# Altium footprint library PCB_CONNECTORS.PcbLib: 676 footprints (part 25 of 43) (continued)
## PHOENIX_1757284 [mm] "PHOENIX MSTBA Serie, Pitch 5.08mm, 12A, 250V, 6 Positions Header"
height 8.6
pads (6):
  round 2.1 hole 1.4: 1(-12.7,0) 2(-7.62,0) 3(-2.54,0) 4(2.54,0) 5(7.62,0) 6(12.7,0)
Top Overlay:
  lines w0.2: -16.24,-8.626 16.24,-8.626 ; -16.24,-7 16.24,-7 ; -13.675,-10 -13.305,-8.7 -12.095,-8.7 -11.725,-10 ; -13.356,-8.88 -12.044,-8.88 ; -12.945,-8.7 -12.932,-8.75 -12.468,-8.75 -12.455,-8.7 ; -8.595,-10 -8.225,-8.7 -7.015,-8.7 -6.645,-10 ; -8.276,-8.88 -6.964,-8.88 ; -7.865,-8.7 -7.852,-8.75 -7.388,-8.75 -7.375,-8.7 ; -3.515,-10 -3.145,-8.7 -1.935,-8.7 -1.565,-10 ; -3.196,-8.88 -1.884,-8.88 ; -2.785,-8.7 -2.772,-8.75 -2.308,-8.75 -2.295,-8.7 ; 1.565,-10 1.935,-8.7 3.145,-8.7 3.515,-10 ; 1.884,-8.88 3.196,-8.88 ; 2.295,-8.7 2.308,-8.75 2.772,-8.75 2.785,-8.7 ; 6.645,-10 7.015,-8.7 8.225,-8.7 8.595,-10 ; 6.964,-8.88 8.276,-8.88 ; 7.375,-8.7 7.388,-8.75 7.852,-8.75 7.865,-8.7 ; 11.725,-10 12.095,-8.7 13.305,-8.7 13.675,-10 ; 12.044,-8.88 13.356,-8.88 ; 12.455,-8.7 12.468,-8.75 12.932,-8.75 12.945,-8.7 ; -16.24,-10 -16.24,2 16.24,2 16.24,-10 -16.24,-10 ; -10.361,-1.05 -10.16,-1.8 -9.959,-1.05 -10.361,-1.05 ; -5.281,-1.05 -5.08,-1.8 -4.879,-1.05 -5.281,-1.05 ; -0.201,-1.05 0,-1.8 0.201,-1.05 -0.201,-1.05 ; 4.879,-1.05 5.08,-1.8 5.281,-1.05 4.879,-1.05 ; 9.959,-1.05 10.16,-1.8 10.361,-1.05 9.959,-1.05
  text "4" at 2.22,-2.4 h1
  text "1" at -12.98,-2.4 h1
  text "2" at -7.98,-2.4 h1
  text "3" at -2.98,-2.4 h1
  text "5" at 7.3,-2.4 h1
  text "6" at 12.38,-2.4 h1
Mechanical 8:
  lines w0.1: -0.5,0 0,0 ; 0,-0.5 0,0 ; 0,0.5 0,0 ; 0.5,0 0,0 ; -12.7,0 -13.2,0 -12.7,0 ; -12.7,0 -12.7,-0.5 -12.7,0 ; -12.7,0 -12.2,0 -12.7,0 ; -12.7,0 -12.7,0.5 -12.7,0 ; -7.62,0 -8.12,0 -7.62,0 ; -7.62,0 -7.62,-0.5 -7.62,0 ; -7.62,0 -7.12,0 -7.62,0 ; -7.62,0 -7.62,0.5 -7.62,0 ; -2.54,0 -3.04,0 -2.54,0 ; -2.54,0 -2.54,-0.5 -2.54,0 ; -2.54,0 -2.04,0 -2.54,0 ; -2.54,0 -2.54,0.5 -2.54,0 ; 2.54,0 2.04,0 2.54,0 ; 2.54,0 2.54,-0.5 2.54,0 ; 2.54,0 3.04,0 2.54,0 ; 2.54,0 2.54,0.5 2.54,0 ; 7.62,0 7.12,0 7.62,0 ; 7.62,0 7.62,-0.5 7.62,0 ; 7.62,0 8.12,0 7.62,0 ; 7.62,0 7.62,0.5 7.62,0 ; 12.7,0 12.2,0 12.7,0 ; 12.7,0 12.7,-0.5 12.7,0 ; 12.7,0 13.2,0 12.7,0 ; 12.7,0 12.7,0.5 12.7,0
Mechanical 14:
  lines w0.1: -16.24,-8.626 16.24,-8.626 ; -16.24,-7 16.24,-7 ; -13.675,-10 -13.305,-8.7 -12.095,-8.7 -11.725,-10 ; -13.356,-8.88 -12.044,-8.88 ; -12.945,-8.7 -12.932,-8.75 -12.468,-8.75 -12.455,-8.7 ; -8.595,-10 -8.225,-8.7 -7.015,-8.7 -6.645,-10 ; -8.276,-8.88 -6.964,-8.88 ; -7.865,-8.7 -7.852,-8.75 -7.388,-8.75 -7.375,-8.7 ; -3.515,-10 -3.145,-8.7 -1.935,-8.7 -1.565,-10 ; -3.196,-8.88 -1.884,-8.88 ; -2.785,-8.7 -2.772,-8.75 -2.308,-8.75 -2.295,-8.7 ; 1.565,-10 1.935,-8.7 3.145,-8.7 3.515,-10 ; 1.884,-8.88 3.196,-8.88 ; 2.295,-8.7 2.308,-8.75 2.772,-8.75 2.785,-8.7 ; 6.645,-10 7.015,-8.7 8.225,-8.7 8.595,-10 ; 6.964,-8.88 8.276,-8.88 ; 7.375,-8.7 7.388,-8.75 7.852,-8.75 7.865,-8.7 ; 11.725,-10 12.095,-8.7 13.305,-8.7 13.675,-10 ; 12.044,-8.88 13.356,-8.88 ; 12.455,-8.7 12.468,-8.75 12.932,-8.75 12.945,-8.7 ; -16.24,-10 -16.24,2 16.24,2 16.24,-10 -16.24,-10 ; -10.361,-1.05 -10.16,-1.8 -9.959,-1.05 -10.361,-1.05 ; -5.281,-1.05 -5.08,-1.8 -4.879,-1.05 -5.281,-1.05 ; -0.201,-1.05 0,-1.8 0.201,-1.05 -0.201,-1.05 ; 4.879,-1.05 5.08,-1.8 5.281,-1.05 4.879,-1.05 ; 9.959,-1.05 10.16,-1.8 10.361,-1.05 9.959,-1.05
3D body "PHOENIX_1757284.stp": height 8.6, standoff -3.5, extent -16.24,-10 16.24,2.002

## PHOENIX_1757307 [mm] "PHOENIX MSTBA Serie, Pitch 5.08mm, 12A, 250V, 8 Positions Header"
height 8.6
pads (8):
  round 2.1 hole 1.4: 1(-17.78,0) 2(-12.7,0) 3(-7.62,0) 4(-2.54,0) 5(2.54,0) 6(7.62,0) 7(12.7,0) 8(17.78,0)
Top Overlay:
  lines w0.2: -21.32,-8.626 21.32,-8.626 ; -21.32,-7 21.32,-7 ; -18.755,-10 -18.385,-8.7 -17.175,-8.7 -16.805,-10 ; -18.436,-8.88 -17.124,-8.88 ; -13.675,-10 -13.305,-8.7 -12.095,-8.7 -11.725,-10 ; -13.356,-8.88 -12.044,-8.88 ; -8.595,-10 -8.225,-8.7 -7.015,-8.7 -6.645,-10 ; -8.276,-8.88 -6.964,-8.88 ; -3.515,-10 -3.145,-8.7 -1.935,-8.7 -1.565,-10 ; -3.196,-8.88 -1.884,-8.88 ; 1.565,-10 1.935,-8.7 3.145,-8.7 3.515,-10 ; 1.884,-8.88 3.196,-8.88 ; 6.645,-10 7.015,-8.7 8.225,-8.7 8.595,-10 ; 6.964,-8.88 8.276,-8.88 ; 11.725,-10 12.095,-8.7 13.305,-8.7 13.675,-10 ; 12.044,-8.88 13.356,-8.88 ; 16.805,-10 17.175,-8.7 18.385,-8.7 18.755,-10 ; 17.124,-8.88 18.436,-8.88 ; -21.32,-10 -21.32,2 21.32,2 21.32,-10 -21.32,-10 ; -15.441,-1.05 -15.039,-1.05 -15.24,-1.8 -15.441,-1.05 ; -10.361,-1.05 -10.16,-1.8 -9.959,-1.05 -10.361,-1.05 ; -5.281,-1.05 -5.08,-1.8 -4.879,-1.05 -5.281,-1.05 ; -0.201,-1.05 0,-1.8 0.201,-1.05 -0.201,-1.05 ; 4.879,-1.05 5.08,-1.8 5.281,-1.05 4.879,-1.05 ; 9.959,-1.05 10.16,-1.8 10.361,-1.05 9.959,-1.05 ; 15.039,-1.05 15.441,-1.05 15.24,-1.8 15.039,-1.05
  text "8" at 17.46,-2.4 h1
  text "5" at 2.26,-2.4 h1
  text "6" at 7.26,-2.4 h1
  text "7" at 12.26,-2.4 h1
  text "4" at -2.86,-2.4 h1
  text "1" at -18.06,-2.4 h1
  text "2" at -13.06,-2.4 h1
  text "3" at -8.06,-2.4 h1
Mechanical 8:
  lines w0.1: -0.5,0 0,0 ; 0,-0.5 0,0 ; 0,0.5 0,0 ; 0.5,0 0,0 ; -17.78,0 -18.28,0 -17.78,0 ; -17.78,0 -17.78,-0.5 -17.78,0 ; -17.78,0 -17.28,0 -17.78,0 ; -17.78,0 -17.78,0.5 -17.78,0 ; -12.7,0 -13.2,0 -12.7,0 ; -12.7,0 -12.7,-0.5 -12.7,0 ; -12.7,0 -12.2,0 -12.7,0 ; -12.7,0 -12.7,0.5 -12.7,0 ; -7.62,0 -8.12,0 -7.62,0 ; -7.62,0 -7.62,-0.5 -7.62,0 ; -7.62,0 -7.12,0 -7.62,0 ; -7.62,0 -7.62,0.5 -7.62,0 ; -2.54,0 -3.04,0 -2.54,0 ; -2.54,0 -2.54,-0.5 -2.54,0 ; -2.54,0 -2.04,0 -2.54,0 ; -2.54,0 -2.54,0.5 -2.54,0 ; 2.54,0 2.04,0 2.54,0 ; 2.54,0 2.54,-0.5 2.54,0 ; 2.54,0 3.04,0 2.54,0 ; 2.54,0 2.54,0.5 2.54,0 ; 7.62,0 7.12,0 7.62,0 ; 7.62,0 7.62,-0.5 7.62,0 ; 7.62,0 8.12,0 7.62,0 ; 7.62,0 7.62,0.5 7.62,0 ; 12.7,0 12.2,0 12.7,0 ; 12.7,0 12.7,-0.5 12.7,0 ; 12.7,0 13.2,0 12.7,0 ; 12.7,0 12.7,0.5 12.7,0 ; 17.78,0 17.28,0 17.78,0 ; 17.78,0 17.78,-0.5 17.78,0 ; 17.78,0 18.28,0 17.78,0 ; 17.78,0 17.78,0.5 17.78,0
Mechanical 14:
  lines w0.1: -21.32,-8.626 21.32,-8.626 ; -21.32,-7 21.32,-7 ; -18.755,-10 -18.385,-8.7 -17.175,-8.7 -16.805,-10 ; -18.436,-8.88 -17.124,-8.88 ; -18.025,-8.7 -18.012,-8.75 -17.548,-8.75 -17.535,-8.7 ; -13.675,-10 -13.305,-8.7 -12.095,-8.7 -11.725,-10 ; -13.356,-8.88 -12.044,-8.88 ; -12.945,-8.7 -12.932,-8.75 -12.468,-8.75 -12.455,-8.7 ; -8.595,-10 -8.225,-8.7 -7.015,-8.7 -6.645,-10 ; -8.276,-8.88 -6.964,-8.88 ; -7.865,-8.7 -7.852,-8.75 -7.388,-8.75 -7.375,-8.7 ; -3.515,-10 -3.145,-8.7 -1.935,-8.7 -1.565,-10 ; -3.196,-8.88 -1.884,-8.88 ; -2.785,-8.7 -2.772,-8.75 -2.308,-8.75 -2.295,-8.7 ; 1.565,-10 1.935,-8.7 3.145,-8.7 3.515,-10 ; 1.884,-8.88 3.196,-8.88 ; 2.295,-8.7 2.308,-8.75 2.772,-8.75 2.785,-8.7 ; 6.645,-10 7.015,-8.7 8.225,-8.7 8.595,-10 ; 6.964,-8.88 8.276,-8.88 ; 7.375,-8.7 7.388,-8.75 7.852,-8.75 7.865,-8.7 ; 11.725,-10 12.095,-8.7 13.305,-8.7 13.675,-10 ; 12.044,-8.88 13.356,-8.88 ; 12.455,-8.7 12.468,-8.75 12.932,-8.75 12.945,-8.7 ; 16.805,-10 17.175,-8.7 18.385,-8.7 18.755,-10 ; 17.124,-8.88 18.436,-8.88 ; 17.535,-8.7 17.548,-8.75 18.012,-8.75 18.025,-8.7 ; -21.32,-10 -21.32,2 21.32,2 21.32,-10 -21.32,-10 ; -15.441,-1.05 -15.039,-1.05 -15.24,-1.8 -15.441,-1.05 ; -10.361,-1.05 -10.16,-1.8 -9.959,-1.05 -10.361,-1.05 ; -5.281,-1.05 -5.08,-1.8 -4.879,-1.05 -5.281,-1.05 ; -0.201,-1.05 0,-1.8 0.201,-1.05 -0.201,-1.05 ; 4.879,-1.05 5.08,-1.8 5.281,-1.05 4.879,-1.05 ; 9.959,-1.05 10.16,-1.8 10.361,-1.05 9.959,-1.05 ; 15.039,-1.05 15.441,-1.05 15.24,-1.8 15.039,-1.05
3D body "PHOENIX_1757307.stp": height 8.6, standoff -3.5, extent -21.32,-10 21.32,2.002

## PHOENIX_1757310 [mm] "PHOENIX MSTBA Serie, Pitch 5.08mm, 12A, 250V, 9 Positions Header"
height 8.6
pads (9):
  round 2.1 hole 1.4: 1(-20.32,0) 2(-15.24,0) 3(-10.16,0) 4(-5.08,0) 5(0,0) 6(5.08,0) 7(10.16,0) 8(15.24,0) 9(20.32,0)
Top Overlay:
  lines w0.2: -23.86,-8.626 23.86,-8.626 ; -23.86,-7 23.86,-7 ; -21.295,-10 -20.925,-8.7 -19.715,-8.7 -19.345,-10 ; -20.976,-8.88 -19.664,-8.88 ; -20.565,-8.7 -20.552,-8.75 -20.088,-8.75 -20.075,-8.7 ; -16.215,-10 -15.845,-8.7 -14.635,-8.7 -14.265,-10 ; -15.896,-8.88 -14.584,-8.88 ; -15.485,-8.7 -15.472,-8.75 -15.008,-8.75 -14.995,-8.7 ; -11.135,-10 -10.765,-8.7 -9.555,-8.7 -9.185,-10 ; -10.816,-8.88 -9.504,-8.88 ; -10.405,-8.7 -10.392,-8.75 -9.928,-8.75 -9.915,-8.7 ; -6.055,-10 -5.685,-8.7 -4.475,-8.7 -4.105,-10 ; -5.736,-8.88 -4.424,-8.88 ; -5.325,-8.7 -5.312,-8.75 -4.848,-8.75 -4.835,-8.7 ; -0.975,-10 -0.605,-8.7 0.605,-8.7 0.975,-10 ; -0.656,-8.88 0.656,-8.88 ; -0.245,-8.7 -0.232,-8.75 0.232,-8.75 0.245,-8.7 ; 4.105,-10 4.475,-8.7 5.685,-8.7 6.055,-10 ; 4.424,-8.88 5.736,-8.88 ; 4.835,-8.7 4.848,-8.75 5.312,-8.75 5.325,-8.7 ; 9.185,-10 9.555,-8.7 10.765,-8.7 11.135,-10 ; 9.504,-8.88 10.816,-8.88 ; 9.915,-8.7 9.928,-8.75 10.392,-8.75 10.405,-8.7 ; 14.265,-10 14.635,-8.7 15.845,-8.7 16.215,-10 ; 14.584,-8.88 15.896,-8.88 ; 14.995,-8.7 15.008,-8.75 15.472,-8.75 15.485,-8.7 ; 19.345,-10 19.715,-8.7 20.925,-8.7 21.295,-10 ; 19.664,-8.88 20.976,-8.88 ; 20.075,-8.7 20.088,-8.75 20.552,-8.75 20.565,-8.7 ; -23.86,-10 23.86,-10 23.86,2 -23.86,2 -23.86,-10 ; -17.981,-1.05 -17.579,-1.05 -17.78,-1.8 -17.981,-1.05 ; -12.901,-1.05 -12.499,-1.05 -12.7,-1.8 -12.901,-1.05 ; -7.821,-1.05 -7.419,-1.05 -7.62,-1.8 -7.821,-1.05 ; -2.741,-1.05 -2.339,-1.05 -2.54,-1.8 -2.741,-1.05 ; 2.339,-1.05 2.741,-1.05 2.54,-1.8 2.339,-1.05 ; 7.419,-1.05 7.821,-1.05 7.62,-1.8 7.419,-1.05 ; 12.499,-1.05 12.901,-1.05 12.7,-1.8 12.499,-1.05 ; 17.579,-1.05 17.981,-1.05 17.78,-1.8 17.579,-1.05
  text "3" at -10.6,-2.4 h1
  text "2" at -15.6,-2.4 h1
  text "1" at -20.6,-2.4 h1
  text "4" at -5.4,-2.4 h1
  text "7" at 9.72,-2.4 h1
  text "6" at 4.72,-2.4 h1
  text "5" at -0.28,-2.4 h1
  text "8" at 14.92,-2.4 h1
  text "9" at 20,-2.4 h1
Mechanical 8:
  lines w0.1: -0.5,0 0,0 ; 0,-0.5 0,0 ; 0,0.5 0,0 ; 0.5,0 0,0 ; -20.32,0 -20.32,0.5 -20.32,0 ; -20.32,0 -19.82,0 -20.32,0 ; -20.32,0 -20.32,-0.5 -20.32,0 ; -20.32,0 -20.82,0 -20.32,0 ; -15.24,0 -15.24,0.5 -15.24,0 ; -15.24,0 -14.74,0 -15.24,0 ; -15.24,0 -15.24,-0.5 -15.24,0 ; -15.24,0 -15.74,0 -15.24,0 ; -10.16,0 -10.16,0.5 -10.16,0 ; -10.16,0 -9.66,0 -10.16,0 ; -10.16,0 -10.16,-0.5 -10.16,0 ; -10.16,0 -10.66,0 -10.16,0 ; -5.08,0 -5.08,0.5 -5.08,0 ; -5.08,0 -4.58,0 -5.08,0 ; -5.08,0 -5.08,-0.5 -5.08,0 ; -5.08,0 -5.58,0 -5.08,0 ; 5.08,0 5.08,0.5 5.08,0 ; 5.08,0 5.58,0 5.08,0 ; 5.08,0 5.08,-0.5 5.08,0 ; 5.08,0 4.58,0 5.08,0 ; 10.16,0 10.16,0.5 10.16,0 ; 10.16,0 10.66,0 10.16,0 ; 10.16,0 10.16,-0.5 10.16,0 ; 10.16,0 9.66,0 10.16,0 ; 15.24,0 15.24,0.5 15.24,0 ; 15.24,0 15.74,0 15.24,0 ; 15.24,0 15.24,-0.5 15.24,0 ; 15.24,0 14.74,0 15.24,0 ; 20.32,0 20.32,0.5 20.32,0 ; 20.32,0 20.82,0 20.32,0 ; 20.32,0 20.32,-0.5 20.32,0 ; 20.32,0 19.82,0 20.32,0
Mechanical 14:
  lines w0.1: -23.86,-8.626 23.86,-8.626 ; -23.86,-7 23.86,-7 ; -21.295,-10 -20.925,-8.7 -19.715,-8.7 -19.345,-10 ; -20.976,-8.88 -19.664,-8.88 ; -20.565,-8.7 -20.552,-8.75 -20.088,-8.75 -20.075,-8.7 ; -16.215,-10 -15.845,-8.7 -14.635,-8.7 -14.265,-10 ; -15.896,-8.88 -14.584,-8.88 ; -15.485,-8.7 -15.472,-8.75 -15.008,-8.75 -14.995,-8.7 ; -11.135,-10 -10.765,-8.7 -9.555,-8.7 -9.185,-10 ; -10.816,-8.88 -9.504,-8.88 ; -10.405,-8.7 -10.392,-8.75 -9.928,-8.75 -9.915,-8.7 ; -6.055,-10 -5.685,-8.7 -4.475,-8.7 -4.105,-10 ; -5.736,-8.88 -4.424,-8.88 ; -5.325,-8.7 -5.312,-8.75 -4.848,-8.75 -4.835,-8.7 ; -0.975,-10 -0.605,-8.7 0.605,-8.7 0.975,-10 ; -0.656,-8.88 0.656,-8.88 ; -0.245,-8.7 -0.232,-8.75 0.232,-8.75 0.245,-8.7 ; 4.105,-10 4.475,-8.7 5.685,-8.7 6.055,-10 ; 4.424,-8.88 5.736,-8.88 ; 4.835,-8.7 4.848,-8.75 5.312,-8.75 5.325,-8.7 ; 9.185,-10 9.555,-8.7 10.765,-8.7 11.135,-10 ; 9.504,-8.88 10.816,-8.88 ; 9.915,-8.7 9.928,-8.75 10.392,-8.75 10.405,-8.7 ; 14.265,-10 14.635,-8.7 15.845,-8.7 16.215,-10 ; 14.584,-8.88 15.896,-8.88 ; 14.995,-8.7 15.008,-8.75 15.472,-8.75 15.485,-8.7 ; 19.345,-10 19.715,-8.7 20.925,-8.7 21.295,-10 ; 19.664,-8.88 20.976,-8.88 ; 20.075,-8.7 20.088,-8.75 20.552,-8.75 20.565,-8.7 ; -23.86,-10 23.86,-10 23.86,2 -23.86,2 -23.86,-10 ; -17.981,-1.05 -17.579,-1.05 -17.78,-1.8 -17.981,-1.05 ; -12.901,-1.05 -12.499,-1.05 -12.7,-1.8 -12.901,-1.05 ; -7.821,-1.05 -7.419,-1.05 -7.62,-1.8 -7.821,-1.05 ; -2.741,-1.05 -2.339,-1.05 -2.54,-1.8 -2.741,-1.05 ; 2.339,-1.05 2.741,-1.05 2.54,-1.8 2.339,-1.05 ; 7.419,-1.05 7.821,-1.05 7.62,-1.8 7.419,-1.05 ; 12.499,-1.05 12.901,-1.05 12.7,-1.8 12.499,-1.05 ; 17.579,-1.05 17.981,-1.05 17.78,-1.8 17.579,-1.05
3D body "PHOENIX_1757310.stp": height 8.6, standoff -3.5, extent -23.86,-10 23.86,2.002

## PHOENIX_1757323 [mm] "PHOENIX MSTBA Serie, Pitch 5.08mm, 12A, 250V, 10 Positions Header"
height 8.6
pads (10):
  round 2.1 hole 1.4: 1(-22.86,0) 2(-17.78,0) 3(-12.7,0) 4(-7.62,0) 5(-2.54,0) 6(2.54,0) 7(7.62,0) 8(12.7,0) 9(17.78,0) 10(22.86,0)
Top Overlay:
  lines w0.2: -26.4,-8.626 26.4,-8.626 ; -26.4,-7 26.4,-7 ; -23.835,-10 -23.465,-8.7 -22.255,-8.7 -21.885,-10 ; -23.516,-8.88 -22.204,-8.88 ; -23.105,-8.7 -23.092,-8.75 -22.628,-8.75 -22.615,-8.7 ; -18.755,-10 -18.385,-8.7 -17.175,-8.7 -16.805,-10 ; -18.436,-8.88 -17.124,-8.88 ; -18.025,-8.7 -18.012,-8.75 -17.548,-8.75 -17.535,-8.7 ; -13.675,-10 -13.305,-8.7 -12.095,-8.7 -11.725,-10 ; -13.356,-8.88 -12.044,-8.88 ; -12.945,-8.7 -12.932,-8.75 -12.468,-8.75 -12.455,-8.7 ; -8.595,-10 -8.225,-8.7 -7.015,-8.7 -6.645,-10 ; -8.276,-8.88 -6.964,-8.88 ; -7.865,-8.7 -7.852,-8.75 -7.388,-8.75 -7.375,-8.7 ; -3.515,-10 -3.145,-8.7 -1.935,-8.7 -1.565,-10 ; -3.196,-8.88 -1.884,-8.88 ; -2.785,-8.7 -2.772,-8.75 -2.308,-8.75 -2.295,-8.7 ; 1.565,-10 1.935,-8.7 3.145,-8.7 3.515,-10 ; 1.884,-8.88 3.196,-8.88 ; 2.295,-8.7 2.308,-8.75 2.772,-8.75 2.785,-8.7 ; 6.645,-10 7.015,-8.7 8.225,-8.7 8.595,-10 ; 6.964,-8.88 8.276,-8.88 ; 7.375,-8.7 7.388,-8.75 7.852,-8.75 7.865,-8.7 ; 11.725,-10 12.095,-8.7 13.305,-8.7 13.675,-10 ; 12.044,-8.88 13.356,-8.88 ; 12.455,-8.7 12.468,-8.75 12.932,-8.75 12.945,-8.7 ; 16.805,-10 17.175,-8.7 18.385,-8.7 18.755,-10 ; 17.124,-8.88 18.436,-8.88 ; 17.535,-8.7 17.548,-8.75 18.012,-8.75 18.025,-8.7 ; 21.885,-10 22.255,-8.7 23.465,-8.7 23.835,-10 ; 22.204,-8.88 23.516,-8.88 ; 22.615,-8.7 22.628,-8.75 23.092,-8.75 23.105,-8.7 ; -26.4,-10 -26.4,2 26.4,2 26.4,-10 -26.4,-10 ; -20.521,-1.05 -20.32,-1.8 -20.119,-1.05 -20.521,-1.05 ; -15.441,-1.05 -15.24,-1.8 -15.039,-1.05 -15.441,-1.05 ; -10.361,-1.05 -10.16,-1.8 -9.959,-1.05 -10.361,-1.05 ; -5.281,-1.05 -5.08,-1.8 -4.879,-1.05 -5.281,-1.05 ; -0.201,-1.05 0,-1.8 0.201,-1.05 -0.201,-1.05 ; 4.879,-1.05 5.08,-1.8 5.281,-1.05 4.879,-1.05 ; 9.959,-1.05 10.16,-1.8 10.361,-1.05 9.959,-1.05 ; 15.039,-1.05 15.24,-1.8 15.441,-1.05 15.039,-1.05 ; 20.119,-1.05 20.32,-1.8 20.521,-1.05 20.119,-1.05
  text "10" at 22.2,-2.4 h1
  text "9" at 17.46,-2.4 h1
  text "8" at 12.38,-2.4 h1
  text "5" at -2.82,-2.4 h1
  text "6" at 2.18,-2.4 h1
  text "7" at 7.18,-2.4 h1
  text "4" at -7.94,-2.4 h1
  text "1" at -23.14,-2.4 h1
  text "2" at -18.14,-2.4 h1
  text "3" at -13.14,-2.4 h1
Mechanical 8:
  lines w0.1: -3.04,0 -2.54,0 ; -2.54,-0.5 -2.54,0 ; -2.54,0.5 -2.54,0 ; -2.04,0 -2.54,0 ; -0.5,0 0,0 ; 0,-0.5 0,0 ; 0,0.5 0,0 ; 0.5,0 0,0 ; -22.86,0 -23.36,0 -22.86,0 ; -22.86,0 -22.86,-0.5 -22.86,0 ; -22.86,0 -22.36,0 -22.86,0 ; -22.86,0 -22.86,0.5 -22.86,0 ; -17.78,0 -18.28,0 -17.78,0 ; -17.78,0 -17.78,-0.5 -17.78,0 ; -17.78,0 -17.28,0 -17.78,0 ; -17.78,0 -17.78,0.5 -17.78,0 ; -12.7,0 -13.2,0 -12.7,0 ; -12.7,0 -12.7,-0.5 -12.7,0 ; -12.7,0 -12.2,0 -12.7,0 ; -12.7,0 -12.7,0.5 -12.7,0 ; 2.54,0 2.04,0 2.54,0 ; 2.54,0 2.54,-0.5 2.54,0 ; 2.54,0 3.04,0 2.54,0 ; 2.54,0 2.54,0.5 2.54,0 ; 7.62,0 7.12,0 7.62,0 ; 7.62,0 7.62,-0.5 7.62,0 ; 7.62,0 8.12,0 7.62,0 ; 7.62,0 7.62,0.5 7.62,0 ; 12.7,0 12.2,0 12.7,0 ; 12.7,0 12.7,-0.5 12.7,0 ; 12.7,0 13.2,0 12.7,0 ; 12.7,0 12.7,0.5 12.7,0 ; 17.78,0 17.28,0 17.78,0 ; 17.78,0 17.78,-0.5 17.78,0 ; 17.78,0 18.28,0 17.78,0 ; 17.78,0 17.78,0.5 17.78,0 ; 22.86,0 22.36,0 22.86,0 ; 22.86,0 22.86,-0.5 22.86,0 ; 22.86,0 23.36,0 22.86,0 ; 22.86,0 22.86,0.5 22.86,0
Mechanical 14:
  lines w0.1: -26.4,-8.626 26.4,-8.626 ; -26.4,-7 26.4,-7 ; -23.835,-10 -23.465,-8.7 -22.255,-8.7 -21.885,-10 ; -23.516,-8.88 -22.204,-8.88 ; -23.105,-8.7 -23.092,-8.75 -22.628,-8.75 -22.615,-8.7 ; -18.755,-10 -18.385,-8.7 -17.175,-8.7 -16.805,-10 ; -18.436,-8.88 -17.124,-8.88 ; -18.025,-8.7 -18.012,-8.75 -17.548,-8.75 -17.535,-8.7 ; -13.675,-10 -13.305,-8.7 -12.095,-8.7 -11.725,-10 ; -13.356,-8.88 -12.044,-8.88 ; -12.945,-8.7 -12.932,-8.75 -12.468,-8.75 -12.455,-8.7 ; -8.595,-10 -8.225,-8.7 -7.015,-8.7 -6.645,-10 ; -8.276,-8.88 -6.964,-8.88 ; -7.865,-8.7 -7.852,-8.75 -7.388,-8.75 -7.375,-8.7 ; -3.515,-10 -3.145,-8.7 -1.935,-8.7 -1.565,-10 ; -3.196,-8.88 -1.884,-8.88 ; -2.785,-8.7 -2.772,-8.75 -2.308,-8.75 -2.295,-8.7 ; 1.565,-10 1.935,-8.7 3.145,-8.7 3.515,-10 ; 1.884,-8.88 3.196,-8.88 ; 2.295,-8.7 2.308,-8.75 2.772,-8.75 2.785,-8.7 ; 6.645,-10 7.015,-8.7 8.225,-8.7 8.595,-10 ; 6.964,-8.88 8.276,-8.88 ; 7.375,-8.7 7.388,-8.75 7.852,-8.75 7.865,-8.7 ; 11.725,-10 12.095,-8.7 13.305,-8.7 13.675,-10 ; 12.044,-8.88 13.356,-8.88 ; 12.455,-8.7 12.468,-8.75 12.932,-8.75 12.945,-8.7 ; 16.805,-10 17.175,-8.7 18.385,-8.7 18.755,-10 ; 17.124,-8.88 18.436,-8.88 ; 17.535,-8.7 17.548,-8.75 18.012,-8.75 18.025,-8.7 ; 21.885,-10 22.255,-8.7 23.465,-8.7 23.835,-10 ; 22.204,-8.88 23.516,-8.88 ; 22.615,-8.7 22.628,-8.75 23.092,-8.75 23.105,-8.7 ; -26.4,-10 -26.4,2 26.4,2 26.4,-10 -26.4,-10 ; -20.521,-1.05 -20.32,-1.8 -20.119,-1.05 -20.521,-1.05 ; -15.441,-1.05 -15.24,-1.8 -15.039,-1.05 -15.441,-1.05 ; -10.361,-1.05 -10.16,-1.8 -9.959,-1.05 -10.361,-1.05 ; -5.281,-1.05 -5.08,-1.8 -4.879,-1.05 -5.281,-1.05 ; -0.201,-1.05 0,-1.8 0.201,-1.05 -0.201,-1.05 ; 4.879,-1.05 5.08,-1.8 5.281,-1.05 4.879,-1.05 ; 9.959,-1.05 10.16,-1.8 10.361,-1.05 9.959,-1.05 ; 15.039,-1.05 15.24,-1.8 15.441,-1.05 15.039,-1.05 ; 20.119,-1.05 20.32,-1.8 20.521,-1.05 20.119,-1.05
3D body "PHOENIX_1757323.stp": height 8.6, standoff -3.5, extent -26.4,-10 26.4,2.002

## PHOENIX_1757349 [mm] "PHOENIX MSTBA Serie, Pitch 5.08mm, 12A, 250V, 12 Positions Header"
height 8.6
pads (12):
  round 2.1 hole 1.4: 1(-27.94,0) 2(-22.86,0) 3(-17.78,0) 4(-12.7,0) 5(-7.62,0) 6(-2.54,0) 7(2.54,0) 8(7.62,0) 9(12.7,0) 10(17.78,0) 11(22.86,0) 12(27.94,0)
Top Overlay:
  lines w0.2: -31.48,-8.626 31.48,-8.626 ; -31.48,-7 31.48,-7 ; -28.915,-10 -28.545,-8.7 -27.335,-8.7 -26.965,-10 ; -28.596,-8.88 -27.284,-8.88 ; -28.185,-8.7 -28.172,-8.75 -27.708,-8.75 -27.695,-8.7 ; -23.835,-10 -23.465,-8.7 -22.255,-8.7 -21.885,-10 ; -23.516,-8.88 -22.204,-8.88 ; -23.105,-8.7 -23.092,-8.75 -22.628,-8.75 -22.615,-8.7 ; -18.755,-10 -18.385,-8.7 -17.175,-8.7 -16.805,-10 ; -18.436,-8.88 -17.124,-8.88 ; -18.025,-8.7 -18.012,-8.75 -17.548,-8.75 -17.535,-8.7 ; -13.675,-10 -13.305,-8.7 -12.095,-8.7 -11.725,-10 ; -13.356,-8.88 -12.044,-8.88 ; -12.945,-8.7 -12.932,-8.75 -12.468,-8.75 -12.455,-8.7 ; -8.595,-10 -8.225,-8.7 -7.015,-8.7 -6.645,-10 ; -8.276,-8.88 -6.964,-8.88 ; -7.865,-8.7 -7.852,-8.75 -7.388,-8.75 -7.375,-8.7 ; -3.515,-10 -3.145,-8.7 -1.935,-8.7 -1.565,-10 ; -3.196,-8.88 -1.884,-8.88 ; -2.785,-8.7 -2.772,-8.75 -2.308,-8.75 -2.295,-8.7 ; 1.565,-10 1.935,-8.7 3.145,-8.7 3.515,-10 ; 1.884,-8.88 3.196,-8.88 ; 2.295,-8.7 2.308,-8.75 2.772,-8.75 2.785,-8.7 ; 6.645,-10 7.015,-8.7 8.225,-8.7 8.595,-10 ; 6.964,-8.88 8.276,-8.88 ; 7.375,-8.7 7.388,-8.75 7.852,-8.75 7.865,-8.7 ; 11.725,-10 12.095,-8.7 13.305,-8.7 13.675,-10 ; 12.044,-8.88 13.356,-8.88 ; 12.455,-8.7 12.468,-8.75 12.932,-8.75 12.945,-8.7 ; 16.805,-10 17.175,-8.7 18.385,-8.7 18.755,-10 ; 17.124,-8.88 18.436,-8.88 ; 17.535,-8.7 17.548,-8.75 18.012,-8.75 18.025,-8.7 ; 21.885,-10 22.255,-8.7 23.465,-8.7 23.835,-10 ; 22.204,-8.88 23.516,-8.88 ; 22.615,-8.7 22.628,-8.75 23.092,-8.75 23.105,-8.7 ; 26.965,-10 27.335,-8.7 28.545,-8.7 28.915,-10 ; 27.284,-8.88 28.596,-8.88 ; 27.695,-8.7 27.708,-8.75 28.172,-8.75 28.185,-8.7 ; -31.48,-10 -31.48,2 31.48,2 31.48,-10 -31.48,-10 ; -25.601,-1.05 -25.4,-1.8 -25.199,-1.05 -25.601,-1.05 ; -20.521,-1.05 -20.32,-1.8 -20.119,-1.05 -20.521,-1.05 ; -15.441,-1.05 -15.24,-1.8 -15.039,-1.05 -15.441,-1.05 ; -10.361,-1.05 -10.16,-1.8 -9.959,-1.05 -10.361,-1.05 ; -5.281,-1.05 -5.08,-1.8 -4.879,-1.05 -5.281,-1.05 ; -0.201,-1.05 0,-1.8 0.201,-1.05 -0.201,-1.05 ; 4.879,-1.05 5.08,-1.8 5.281,-1.05 4.879,-1.05 ; 9.959,-1.05 10.16,-1.8 10.361,-1.05 9.959,-1.05 ; 15.039,-1.05 15.24,-1.8 15.441,-1.05 15.039,-1.05 ; 20.119,-1.05 20.32,-1.8 20.521,-1.05 20.119,-1.05 ; 25.199,-1.05 25.4,-1.8 25.601,-1.05 25.199,-1.05
  text "10" at 17.12,-2.4 h1
  text "9" at 12.38,-2.4 h1
  text "8" at 7.3,-2.4 h1
  text "5" at -7.9,-2.4 h1
  text "6" at -2.9,-2.4 h1
  text "7" at 2.1,-2.4 h1
  text "4" at -13.02,-2.4 h1
  text "1" at -28.22,-2.4 h1
  text "2" at -23.22,-2.4 h1
  text "3" at -18.22,-2.4 h1
  text "11" at 22.2,-2.4 h1
  text "12" at 27.28,-2.4 h1
Mechanical 8:
  lines w0.1: -3.04,0 -2.54,0 ; -2.54,-0.5 -2.54,0 ; -2.54,0.5 -2.54,0 ; -2.04,0 -2.54,0 ; -0.5,0 0,0 ; 0,-0.5 0,0 ; 0,0.5 0,0 ; 0.5,0 0,0 ; -27.94,0 -28.44,0 -27.94,0 ; -27.94,0 -27.94,-0.5 -27.94,0 ; -27.94,0 -27.44,0 -27.94,0 ; -27.94,0 -27.94,0.5 -27.94,0 ; -22.86,0 -23.36,0 -22.86,0 ; -22.86,0 -22.86,-0.5 -22.86,0 ; -22.86,0 -22.36,0 -22.86,0 ; -22.86,0 -22.86,0.5 -22.86,0 ; -17.78,0 -18.28,0 -17.78,0 ; -17.78,0 -17.78,-0.5 -17.78,0 ; -17.78,0 -17.28,0 -17.78,0 ; -17.78,0 -17.78,0.5 -17.78,0 ; -12.7,0 -13.2,0 -12.7,0 ; -12.7,0 -12.7,-0.5 -12.7,0 ; -12.7,0 -12.2,0 -12.7,0 ; -12.7,0 -12.7,0.5 -12.7,0 ; 2.54,0 2.04,0 2.54,0 ; 2.54,0 2.54,-0.5 2.54,0 ; 2.54,0 3.04,0 2.54,0 ; 2.54,0 2.54,0.5 2.54,0 ; 7.62,0 7.12,0 7.62,0 ; 7.62,0 7.62,-0.5 7.62,0 ; 7.62,0 8.12,0 7.62,0 ; 7.62,0 7.62,0.5 7.62,0 ; 12.7,0 12.2,0 12.7,0 ; 12.7,0 12.7,-0.5 12.7,0 ; 12.7,0 13.2,0 12.7,0 ; 12.7,0 12.7,0.5 12.7,0 ; 17.78,0 17.28,0 17.78,0 ; 17.78,0 17.78,-0.5 17.78,0 ; 17.78,0 18.28,0 17.78,0 ; 17.78,0 17.78,0.5 17.78,0 ; 22.86,0 22.36,0 22.86,0 ; 22.86,0 22.86,-0.5 22.86,0 ; 22.86,0 23.36,0 22.86,0 ; 22.86,0 22.86,0.5 22.86,0 ; 27.94,0 27.44,0 27.94,0 ; 27.94,0 27.94,-0.5 27.94,0 ; 27.94,0 28.44,0 27.94,0 ; 27.94,0 27.94,0.5 27.94,0
Mechanical 14:
  lines w0.1: -31.48,-8.626 31.48,-8.626 ; -31.48,-7 31.48,-7 ; -28.915,-10 -28.545,-8.7 -27.335,-8.7 -26.965,-10 ; -28.596,-8.88 -27.284,-8.88 ; -28.185,-8.7 -28.172,-8.75 -27.708,-8.75 -27.695,-8.7 ; -23.835,-10 -23.465,-8.7 -22.255,-8.7 -21.885,-10 ; -23.516,-8.88 -22.204,-8.88 ; -23.105,-8.7 -23.092,-8.75 -22.628,-8.75 -22.615,-8.7 ; -18.755,-10 -18.385,-8.7 -17.175,-8.7 -16.805,-10 ; -18.436,-8.88 -17.124,-8.88 ; -18.025,-8.7 -18.012,-8.75 -17.548,-8.75 -17.535,-8.7 ; -13.675,-10 -13.305,-8.7 -12.095,-8.7 -11.725,-10 ; -13.356,-8.88 -12.044,-8.88 ; -12.945,-8.7 -12.932,-8.75 -12.468,-8.75 -12.455,-8.7 ; -8.595,-10 -8.225,-8.7 -7.015,-8.7 -6.645,-10 ; -8.276,-8.88 -6.964,-8.88 ; -7.865,-8.7 -7.852,-8.75 -7.388,-8.75 -7.375,-8.7 ; -3.515,-10 -3.145,-8.7 -1.935,-8.7 -1.565,-10 ; -3.196,-8.88 -1.884,-8.88 ; -2.785,-8.7 -2.772,-8.75 -2.308,-8.75 -2.295,-8.7 ; 1.565,-10 1.935,-8.7 3.145,-8.7 3.515,-10 ; 1.884,-8.88 3.196,-8.88 ; 2.295,-8.7 2.308,-8.75 2.772,-8.75 2.785,-8.7 ; 6.645,-10 7.015,-8.7 8.225,-8.7 8.595,-10 ; 6.964,-8.88 8.276,-8.88 ; 7.375,-8.7 7.388,-8.75 7.852,-8.75 7.865,-8.7 ; 11.725,-10 12.095,-8.7 13.305,-8.7 13.675,-10 ; 12.044,-8.88 13.356,-8.88 ; 12.455,-8.7 12.468,-8.75 12.932,-8.75 12.945,-8.7 ; 16.805,-10 17.175,-8.7 18.385,-8.7 18.755,-10 ; 17.124,-8.88 18.436,-8.88 ; 17.535,-8.7 17.548,-8.75 18.012,-8.75 18.025,-8.7 ; 21.885,-10 22.255,-8.7 23.465,-8.7 23.835,-10 ; 22.204,-8.88 23.516,-8.88 ; 22.615,-8.7 22.628,-8.75 23.092,-8.75 23.105,-8.7 ; 26.965,-10 27.335,-8.7 28.545,-8.7 28.915,-10 ; 27.284,-8.88 28.596,-8.88 ; 27.695,-8.7 27.708,-8.75 28.172,-8.75 28.185,-8.7 ; -31.48,-10 -31.48,2 31.48,2 31.48,-10 -31.48,-10 ; -25.601,-1.05 -25.4,-1.8 -25.199,-1.05 -25.601,-1.05 ; -20.521,-1.05 -20.32,-1.8 -20.119,-1.05 -20.521,-1.05 ; -15.441,-1.05 -15.24,-1.8 -15.039,-1.05 -15.441,-1.05 ; -10.361,-1.05 -10.16,-1.8 -9.959,-1.05 -10.361,-1.05 ; -5.281,-1.05 -5.08,-1.8 -4.879,-1.05 -5.281,-1.05 ; -0.201,-1.05 0,-1.8 0.201,-1.05 -0.201,-1.05 ; 4.879,-1.05 5.08,-1.8 5.281,-1.05 4.879,-1.05 ; 9.959,-1.05 10.16,-1.8 10.361,-1.05 9.959,-1.05 ; 15.039,-1.05 15.24,-1.8 15.441,-1.05 15.039,-1.05 ; 20.119,-1.05 20.32,-1.8 20.521,-1.05 20.119,-1.05 ; 25.199,-1.05 25.4,-1.8 25.601,-1.05 25.199,-1.05
3D body "PHOENIX_1757349.stp": height 8.6, standoff -3.5, extent -31.48,-10 31.48,2.002

## PHOENIX_1766660 [mm] "PCB Header, 12A 400 V, Pitch: 7.5mm, 2 Positions, GMSTBVA Serie"
height 12
pads (2):
  round 2.1 hole 1.4: 1(-3.75,0) 2(3.75,0)
Top Overlay:
  lines w0.2: -7.5,4.3 -4.725,4.3 ; -6.7,-2.13 -5.79,-2.13 ; -6.7,3.163 6.7,3.163 ; -4.394,3.163 -4.725,3.475 ; -4.355,3.163 -4.355,4.773 ; -3.145,3.163 -3.145,4.773 ; -3.106,3.163 -2.775,3.475 ; 3.106,3.163 2.775,3.475 ; 3.145,3.163 3.145,4.773 ; 4.355,3.163 4.355,4.773 ; 4.394,3.163 4.725,3.475 ; 6.7,-2.13 5.79,-2.13 ; 7.5,4.3 4.725,4.3 ; -5.904,-2.43 ccw(c-3.75,0.07) -1.596,-2.43 ; -5.904,-2.43 -5.79,-2.13 ; -5.904,-2.43 -6.7,-2.43 -6.7,3.475 -4.725,3.475 ; -5.79,-2.13 ccw(c-3.75,0.07) -1.71,-2.13 ; -4.725,3.475 -4.725,4.3 ; -4.725,4.3 -4.355,4.773 ; -4.355,4.773 -3.145,4.773 ; -3.145,4.773 -2.775,4.3 ; -2.775,3.475 2.775,3.475 ; -2.775,3.475 -2.775,4.3 ; -2.775,4.3 2.775,4.3 ; -1.71,-2.13 1.71,-2.13 ; -1.71,-2.13 -1.596,-2.43 ; -1.596,-2.43 1.596,-2.43 ; 1.596,-2.43 ccw(c3.75,0.07) 5.904,-2.43 ; 1.596,-2.43 1.71,-2.13 ; 1.71,-2.13 ccw(c3.75,0.07) 5.79,-2.13 ; 2.775,3.475 2.775,4.3 ; 2.775,4.3 3.145,4.773 ; 3.145,4.773 4.355,4.773 ; 4.355,4.773 4.725,4.3 ; 4.725,3.475 4.725,4.3 ; 4.725,3.475 6.7,3.475 6.7,-2.43 5.904,-2.43 ; 5.79,-2.13 5.904,-2.43 ; -7.5,-3.8 -7.5,4.8 7.5,4.8 7.5,-3.8 -7.5,-3.8
  text "1" at -3.91,3.46 h1
  text "2" at 3.53,3.575 h0.75
Mechanical 8:
  lines w0.1: -4.25,0 -3.75,0 ; -3.75,-0.5 -3.75,0 ; -3.75,0.5 -3.75,0 ; -3.25,0 -3.75,0 ; -0.5,0 0,0 ; 0,-0.5 0,0 ; 0,0.5 0,0 ; 0.5,0 0,0 ; 3.25,0 3.75,0 ; 3.75,-0.5 3.75,0 ; 3.75,0.5 3.75,0 ; 4.25,0 3.75,0
Mechanical 14:
  circle w0.1: c3.75,0.07 r1.4
  lines w0.1: -7.5,4.3 -4.725,4.3 ; -6.7,-2.13 -5.79,-2.13 ; -6.7,3.163 6.7,3.163 ; -4.394,3.163 -4.725,3.475 ; -4.355,3.163 -4.355,4.773 ; -3.145,3.163 -3.145,4.773 ; -3.106,3.163 -2.775,3.475 ; 3.106,3.163 2.775,3.475 ; 3.145,3.163 3.145,4.773 ; 4.355,3.163 4.355,4.773 ; 4.394,3.163 4.725,3.475 ; 6.7,-2.13 5.79,-2.13 ; 7.5,4.3 4.725,4.3 ; -5.904,-2.43 ccw(c-3.75,0.07) -1.596,-2.43 ; -5.904,-2.43 -5.79,-2.13 ; -5.904,-2.43 -6.7,-2.43 -6.7,3.475 -4.725,3.475 ; -5.79,-2.13 ccw(c-3.75,0.07) -1.71,-2.13 ; -4.725,3.475 -4.725,4.3 ; -4.725,4.3 -4.355,4.773 ; -4.355,4.773 -3.145,4.773 ; -3.145,4.773 -2.775,4.3 ; -2.775,3.475 2.775,3.475 ; -2.775,3.475 -2.775,4.3 ; -2.775,4.3 2.775,4.3 ; -1.71,-2.13 1.71,-2.13 ; -1.71,-2.13 -1.596,-2.43 ; -1.596,-2.43 1.596,-2.43 ; 1.596,-2.43 ccw(c3.75,0.07) 5.904,-2.43 ; 1.596,-2.43 1.71,-2.13 ; 1.71,-2.13 ccw(c3.75,0.07) 5.79,-2.13 ; 2.775,3.475 2.775,4.3 ; 2.775,4.3 3.145,4.773 ; 3.145,4.773 4.355,4.773 ; 4.355,4.773 4.725,4.3 ; 4.725,3.475 4.725,4.3 ; 4.725,3.475 6.7,3.475 6.7,-2.43 5.904,-2.43 ; 5.79,-2.13 5.904,-2.43 ; -7.5,-3.8 -7.5,4.8 7.5,4.8 7.5,-3.8 -7.5,-3.8 ; -4.45,-1.142 ccw(c-3.75,0.07) -4.45,1.282 -4.45,-1.142
  text "1" at -3.91,3.46 h1
  text "2" at 3.53,3.575 h0.75
3D body "PHOENIX_1766660.stp": height 12, standoff -3.9, extent -7.5,-3.8 7.5,4.8